# Altium footprint library PCB_library.PcbLib: 28 footprints (part 1 of 2)
Each footprint in its own frame and in the unit in brackets; x right, y up, seen from the top. Pads: shape width x height; smd on the part's side, far side on the other; paste and mask are expansions set on the pad; w line width, h text height; cw(c..) or ccw(c..) is an arc to the next point about the centre after c.
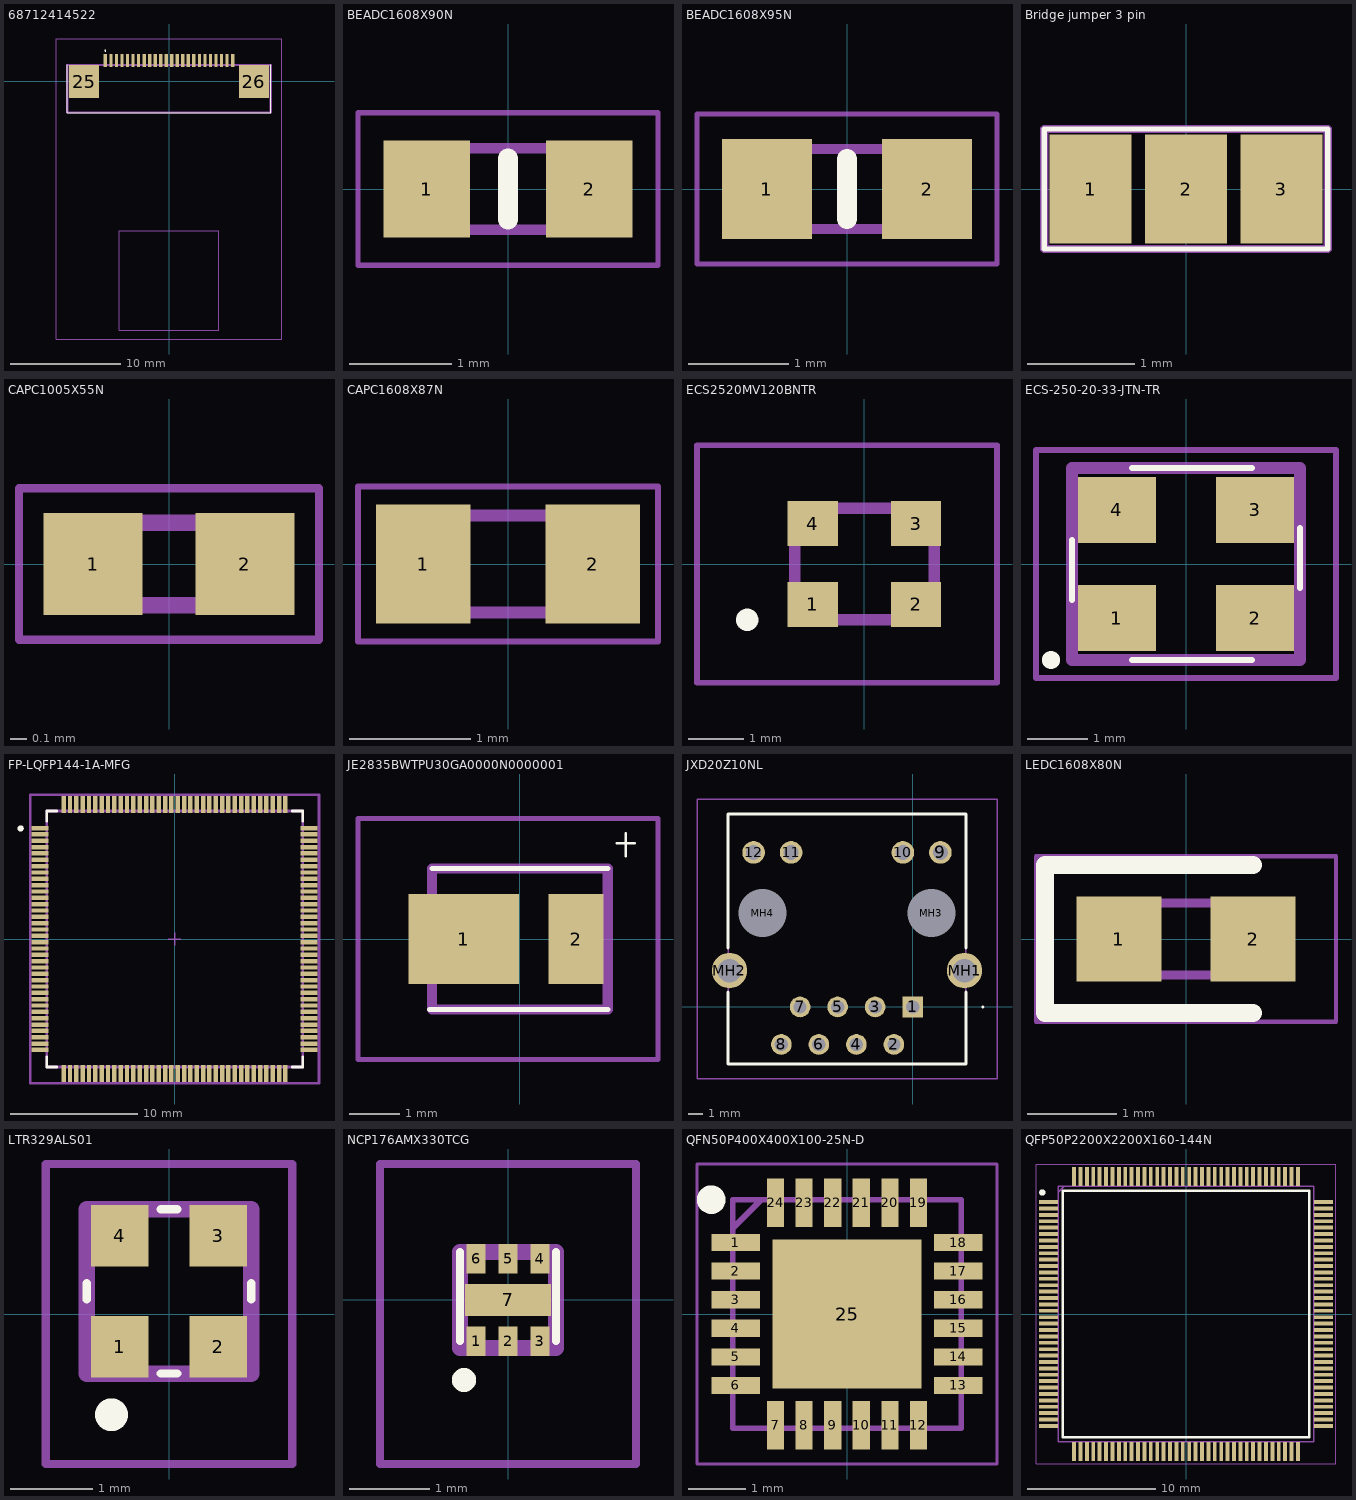
[diagram p0: the footprints below, top view; thin cyan lines are the x and y axes]

## 68712414522 [mm]
pads (26):
  rect 0.3x1.2 smd: 1(-5.75,1.875) 2(-5.25,1.875) 3(-4.75,1.875) 4(-4.25,1.875) 5(-3.75,1.875) 6(-3.25,1.875) 7(-2.75,1.875) 8(-2.25,1.875) 9(-1.75,1.875) 10(-1.25,1.875) 11(-0.75,1.875) 12(-0.25,1.875) 13(0.25,1.875) 14(0.75,1.875) 15(1.25,1.875) 16(1.75,1.875) 17(2.25,1.875) 18(2.75,1.875) 19(3.25,1.875) 20(3.75,1.875) 21(4.25,1.875) 22(4.75,1.875) 23(5.25,1.875) 24(5.75,1.875)
  rect 2.7x3 smd: 25(-7.68,-0.025) 26(7.68,-0.025)
Top Overlay:
  lines w0.1: -9.2,1.475 -9.2,-2.825 9.2,-2.825 9.2,1.475 ; -5.8,2.775 ccw(c-5.75,2.775) -5.7,2.775 ccw(c-5.75,2.775) -5.8,2.775
Mechanical 13:
  lines w0.2: -9.2,-2.825 -9.2,1.475 9.2,1.475 9.2,-2.825 -9.2,-2.825
Mechanical 15:
  lines w0.1: -10.2,-23.3 -10.2,3.825 10.2,3.825 10.2,-23.3 -10.2,-23.3 ; -4.5,-22.5 4.5,-22.5 4.5,-13.5 -4.5,-13.5 -4.5,-22.5
3D body "68712414522.stp": height 2.1, standoff 0, extent -9.2,-2.825 9.2,2.445

## BEADC1608X90N [mm]
pads (2):
  rect 0.85x0.95 smd: 1(-0.8,0) 2(0.8,0)
Top Overlay:
  lines w0.2: 0,-0.3 0,0.3
Mechanical 13:
  lines w0.1: -0.8,-0.4 -0.8,0.4 0.8,0.4 0.8,-0.4 -0.8,-0.4
Mechanical 15:
  lines w0.05: -1.475,-0.75 -1.475,0.75 1.475,0.75 1.475,-0.75 -1.475,-0.75
3D body "FBMH1608HM601-T.stp": height 0.9, standoff 0, extent -0.8,-0.4 0.8,0.4

## BEADC1608X95N [mm]
pads (2):
  rect 0.9x1 smd: 1(-0.8,0) 2(0.8,0)
Top Overlay:
  lines w0.2: 0,-0.3 0,0.3
Mechanical 13:
  lines w0.1: -0.8,-0.4 0.8,-0.4 0.8,0.4 -0.8,0.4 -0.8,-0.4
Mechanical 15:
  lines w0.05: -1.5,-0.75 1.5,-0.75 1.5,0.75 -1.5,0.75 -1.5,-0.75
3D body "FCM1608KF-601T05.stp": height 0.95, standoff 0, extent -0.8,-0.4 0.8,0.4

## Bridge jumper 3 pin [mil]
pads (3):
  rect 30x40 smd mask+0: 1(-35,0) 2(0,0) 3(35,0)
Top Overlay:
  lines w2: -52,-22 52,-22 52,22 -52,22 -52,-22
Mechanical 1:
  lines w3: -52,-22 -52,22 52,22 52,-22 -52,-22

## CAPC1005X55N [mm]
pads (2):
  rect 0.6x0.62 smd: 1(-0.46,0) 2(0.46,0)
Mechanical 13:
  lines w0.1: -0.5,-0.25 -0.5,0.25 0.5,0.25 0.5,-0.25 -0.5,-0.25
Mechanical 15:
  lines w0.05: -0.91,-0.46 -0.91,0.46 0.91,0.46 0.91,-0.46 -0.91,-0.46
3D body "CC0402KRX7R7BB104.stp": height 0.55, standoff 0, extent -0.52,-0.28 0.53,0.27

## CAPC1608X87N [mm]
pads (2):
  rect 0.78x0.98 smd: 1(-0.7,0) 2(0.7,0)
Mechanical 13:
  lines w0.1: -0.8,-0.4 -0.8,0.4 0.8,0.4 0.8,-0.4 -0.8,-0.4
Mechanical 15:
  lines w0.05: -1.24,-0.64 -1.24,0.64 1.24,0.64 1.24,-0.64 -1.24,-0.64
3D body "C0603C300J5GACTU.stp": height 0.87, standoff 0, extent -0.87,-0.48 0.88,0.47

## ECS2520MV120BNTR [mm]
pads (4):
  rect 0.9x0.8 smd: 1(-0.925,-0.725) 2(0.925,-0.725) 3(0.925,0.725) 4(-0.925,0.725)
Top Overlay:
  lines w0.2: -2.2,-1 cw(c-2.1,-1) -2,-1 cw(c-2.1,-1) -2.2,-1
Mechanical 13:
  lines w0.2: -1.25,-1 1.25,-1 1.25,1 -1.25,1 -1.25,-1
Mechanical 15:
  lines w0.1: -3,-2.125 2.375,-2.125 2.375,2.125 -3,2.125 -3,-2.125
3D body "ECS-2520MV-120-BN-TR.stp": height 1, standoff 0, extent -1.295,-1.045 1.295,1.045

## ECS-250-20-33-JTN-TR [mm]
pads (4):
  rect 1.3x1.1 smd: 1(-1.15,-0.9) 2(1.15,-0.9) 3(1.15,0.9) 4(-1.15,0.9)
Top Overlay:
  lines w0.1: -1.9,-0.6 -1.9,0.4 ; -0.9,-1.6 1.1,-1.6 ; -0.9,1.6 1.1,1.6 ; 1.9,-0.4 1.9,0.6
  lines w0.2: -2.3,-1.6 ccw(c-2.25,-1.6) -2.2,-1.6 ; -2.3,-1.6 cw(c-2.25,-1.6) -2.2,-1.6 ; -2.3,-1.6 ccw(c-2.25,-1.6) -2.2,-1.6
Mechanical 13:
  lines w0.2: -1.9,-1.6 -0.875,-1.6 0.975,-1.6 1.9,-1.6 1.9,1.6 0.975,1.6 -0.875,1.6 -1.9,1.6 -1.9,-1.6
Mechanical 15:
  lines w0.1: -2.5,-1.9 2.5,-1.9 2.5,1.9 -2.5,1.9 -2.5,-1.9
3D body: height 0.25, standoff 0, extent -2.1,-1.8 2.1,1.8

## FP-LQFP144-1A-MFG [mm]
pads (144):
  rect 1.35x0.35 smd paste+0 mask+0: 1(-10.625,8.75) 2(-10.625,8.25) 3(-10.625,7.75) 4(-10.625,7.25) 5(-10.625,6.75) 6(-10.625,6.25) 7(-10.625,5.75) 8(-10.625,5.25) 9(-10.625,4.75) 10(-10.625,4.25) 11(-10.625,3.75) 12(-10.625,3.25) 13(-10.625,2.75) 14(-10.625,2.25) 15(-10.625,1.75) 16(-10.625,1.25) 17(-10.625,0.75) 18(-10.625,0.25) 19(-10.625,-0.25) 20(-10.625,-0.75) 21(-10.625,-1.25) 22(-10.625,-1.75) 23(-10.625,-2.25) 24(-10.625,-2.75) 25(-10.625,-3.25) 26(-10.625,-3.75) 27(-10.625,-4.25) 28(-10.625,-4.75) 29(-10.625,-5.25) 30(-10.625,-5.75) 31(-10.625,-6.25) 32(-10.625,-6.75) 33(-10.625,-7.25) 34(-10.625,-7.75) 35(-10.625,-8.25) 36(-10.625,-8.75) 73(10.625,-8.75) 74(10.625,-8.25) 75(10.625,-7.75) 76(10.625,-7.25) 77(10.625,-6.75) 78(10.625,-6.25) 79(10.625,-5.75) 80(10.625,-5.25) 81(10.625,-4.75) 82(10.625,-4.25) 83(10.625,-3.75) 84(10.625,-3.25) 85(10.625,-2.75) 86(10.625,-2.25) 87(10.625,-1.75) 88(10.625,-1.25) 89(10.625,-0.75) 90(10.625,-0.25) 91(10.625,0.25) 92(10.625,0.75) 93(10.625,1.25) 94(10.625,1.75) 95(10.625,2.25) 96(10.625,2.75) 97(10.625,3.25) 98(10.625,3.75) 99(10.625,4.25) 100(10.625,4.75) 101(10.625,5.25) 102(10.625,5.75) 103(10.625,6.25) 104(10.625,6.75) 105(10.625,7.25) 106(10.625,7.75) 107(10.625,8.25) 108(10.625,8.75)
  rect 0.35x1.35 smd paste+0 mask+0: 37(-8.75,-10.625) 38(-8.25,-10.625) 39(-7.75,-10.625) 40(-7.25,-10.625) 41(-6.75,-10.625) 42(-6.25,-10.625) 43(-5.75,-10.625) 44(-5.25,-10.625) 45(-4.75,-10.625) 46(-4.25,-10.625) 47(-3.75,-10.625) 48(-3.25,-10.625) 49(-2.75,-10.625) 50(-2.25,-10.625) 51(-1.75,-10.625) 52(-1.25,-10.625) 53(-0.75,-10.625) 54(-0.25,-10.625) 55(0.25,-10.625) 56(0.75,-10.625) 57(1.25,-10.625) 58(1.75,-10.625) 59(2.25,-10.625) 60(2.75,-10.625) 61(3.25,-10.625) 62(3.75,-10.625) 63(4.25,-10.625) 64(4.75,-10.625) 65(5.25,-10.625) 66(5.75,-10.625) 67(6.25,-10.625) 68(6.75,-10.625) 69(7.25,-10.625) 70(7.75,-10.625) 71(8.25,-10.625) 72(8.75,-10.625) 109(8.75,10.625) 110(8.25,10.625) 111(7.75,10.625) 112(7.25,10.625) 113(6.75,10.625) 114(6.25,10.625) 115(5.75,10.625) 116(5.25,10.625) 117(4.75,10.625) 118(4.25,10.625) 119(3.75,10.625) 120(3.25,10.625) 121(2.75,10.625) 122(2.25,10.625) 123(1.75,10.625) 124(1.25,10.625) 125(0.75,10.625) 126(0.25,10.625) 127(-0.25,10.625) 128(-0.75,10.625) 129(-1.25,10.625) 130(-1.75,10.625) 131(-2.25,10.625) 132(-2.75,10.625) 133(-3.25,10.625) 134(-3.75,10.625) 135(-4.25,10.625) 136(-4.75,10.625) 137(-5.25,10.625) 138(-5.75,10.625) 139(-6.25,10.625) 140(-6.75,10.625) 141(-7.25,10.625) 142(-7.75,10.625) 143(-8.25,10.625) 144(-8.75,10.625)
Top Overlay:
  circle w0.25: c-12.15,8.725 r0.125
  lines w0.2: -10.1,-9.3 -10.1,-10.1 -9.3,-10.1 ; -10.1,9.3 -10.1,10.1 -9.3,10.1 ; 9.3,-10.1 10.1,-10.1 10.1,-9.3 ; 9.3,10.1 10.1,10.1 10.1,9.3
Top 3D Body:
  lines w0.2: -10.1,-10.1 -10.1,10.1 10.1,10.1 10.1,-10.1 -10.1,-10.1
Top Courtyard:
  lines w0.2: -11.4,-11.4 -11.4,11.4 11.4,11.4 11.4,-11.4 -11.4,-11.4
Top Assembly:
  lines w0.2: -11.4,-11.4 -11.4,11.4 11.4,11.4 11.4,-11.4 -11.4,-11.4
  text ".Designator" at 0,0.188 h1
Top Component Center:
  lines w0.1: -0.5,0 0.5,0 ; 0,-0.5 0,0.5
3D body "IC_STMicroelectronics_STM32F767ZIT7TR_eec.STEP": height 0.25, standoff 0, extent -11.4,-11.4 11.4,11.4

## JE2835BWTPU30GA0000N0000001 [mm]
pads (2):
  rect 2.2x1.8 smd: 1(-1.12,0)
  rect 1.1x1.8 smd: 2(1.12,0)
Top Overlay:
  lines w0.051: 1.93,1.905 2.286,1.905 ; 2.108,1.651 2.108,2.108
  lines w0.1: -1.8,-1.4 1.75,-1.4 ; -1.75,1.4 1.75,1.4
Mechanical 13:
  lines w0.2: -1.75,-1.4 -1.75,1.4 1.75,1.4 1.75,-1.4 -1.75,-1.4
Mechanical 15:
  lines w0.1: -3.22,-2.4 -3.22,2.4 2.75,2.4 2.75,-2.4 -3.22,-2.4

## JXD20Z10NL [mm]
pads (16):
  rect 1.4x1.4 hole 0.9: 1(0,0)
  round 1.4 hole 0.9: 2(-1.27,-2.54) 3(-2.54,0) 4(-3.81,-2.54) 5(-5.08,0) 6(-6.35,-2.54) 7(-7.62,0) 8(-8.89,-2.54)
  round 1.53 hole 1.02: 9(1.88,10.46) 10(-0.66,10.46) 11(-8.23,10.46) 12(-10.77,10.46)
  round 2.4 hole 1.6: MH1(3.51,2.46) MH2(-12.4,2.46)
  round 1.625 hole 3.25 unplated: MH3(1.27,6.35) MH4(-10.16,6.35)
Top Overlay:
  lines w0.1: 4.7,0 ccw(c4.75,0) 4.8,0 ccw(c4.75,0) 4.7,0
  lines w0.2: -12.495,1 -12.495,-3.85 3.6,-3.85 3.605,1 ; -12.495,4 -12.495,13.05 3.6,13.05 3.6,4
Mechanical 13:
  lines w0.1: -12.495,-3.85 -12.495,13.05 3.605,13.05 3.605,-3.85 -12.495,-3.85
Mechanical 15:
  lines w0.1: -14.6,-4.85 -14.6,14.05 5.71,14.05 5.71,-4.85 -14.6,-4.85
3D body "JXD2-0Z10NL.stp": height 17.3, standoff -5, extent -13.1,-3.85 4.21,13.05

## LEDC1608X80N [mm]
pads (2):
  rect 0.95x0.95 smd: 1(-0.75,0) 2(0.75,0)
Top Overlay:
  lines w0.2: 0.75,-0.825 -1.575,-0.825 -1.575,0.825 0.75,0.825
Mechanical 13:
  lines w0.1: -0.8,0.133 -0.533,0.4 ; -0.8,-0.4 0.8,-0.4 0.8,0.4 -0.8,0.4 -0.8,-0.4
Mechanical 15:
  lines w0.05: -1.675,-0.925 1.675,-0.925 1.675,0.925 -1.675,0.925 -1.675,-0.925
3D body "150060RS75000.stp": height 0.7, standoff 0, extent -0.8,-0.4 0.8,0.4

## LTR329ALS01 [mm]
pads (4):
  rect 0.7x0.75 smd: 1(-0.6,-0.4) 2(0.6,-0.4) 3(0.6,0.95) 4(-0.6,0.95)
Top Overlay:
  lines w0.1: -1,0.175 -1,0.375 ; -0.1,-0.725 0.1,-0.725 ; -0.1,1.275 0.1,1.275 ; 1,0.175 1,0.375
  lines w0.2: -0.8,-1.225 cw(c-0.7,-1.225) -0.6,-1.225 cw(c-0.7,-1.225) -0.8,-1.225
Mechanical 13:
  lines w0.2: -1,-0.725 1,-0.725 1,1.275 -1,1.275 -1,-0.725
Mechanical 15:
  lines w0.1: -1.5,-1.825 1.5,-1.825 1.5,1.825 -1.5,1.825 -1.5,-1.825
3D body "LTR-329ALS-01.stp": height 0.71, standoff -0.01, extent -1,-0.7 1,1.3

## NCP176AMX330TCG [mm]
pads (7):
  rect 0.24x0.37 smd: 1(-0.4,-0.515) 2(0,-0.515) 3(0.4,-0.515) 4(0.4,0.515) 5(0,0.515) 6(-0.4,0.515)
  rect 1.08x0.4 smd: 7(0,0)
Top Overlay:
  lines w0.1: -0.6,-0.515 -0.6,0.6 ; 0.6,-0.515 0.6,0.6
  lines w0.2: -0.6,-1 cw(c-0.55,-1) -0.5,-1 cw(c-0.55,-1) -0.6,-1
Mechanical 13:
  lines w0.2: -0.6,-0.6 0.6,-0.6 0.6,0.6 -0.6,0.6 -0.6,-0.6
Mechanical 15:
  lines w0.1: -1.6,-2.05 1.6,-2.05 1.6,1.7 -1.6,1.7 -1.6,-2.05
3D body "NCP176AMX330TCG.stp": height 0.55, standoff 0, extent -0.6,-0.6 0.6,0.6

## QFN50P400X400X100-25N-D [mm]
pads (25):
  rect 0.85x0.3 smd: 1(-1.95,1.25) 2(-1.95,0.75) 3(-1.95,0.25) 4(-1.95,-0.25) 5(-1.95,-0.75) 6(-1.95,-1.25) 13(1.95,-1.25) 14(1.95,-0.75) 15(1.95,-0.25) 16(1.95,0.25) 17(1.95,0.75) 18(1.95,1.25)
  rect 0.3x0.85 smd: 7(-1.25,-1.95) 8(-0.75,-1.95) 9(-0.25,-1.95) 10(0.25,-1.95) 11(0.75,-1.95) 12(1.25,-1.95) 19(1.25,1.95) 20(0.75,1.95) 21(0.25,1.95) 22(-0.25,1.95) 23(-0.75,1.95) 24(-1.25,1.95)
  rect 2.6x2.6 smd: 25(0,0)
Top Overlay:
  circle w0.25: c-2.375,2 r0.125
Mechanical 13:
  lines w0.1: -2,1.5 -1.5,2 ; -2,-2 2,-2 2,2 -2,2 -2,-2
Mechanical 15:
  lines w0.05: -2.625,-2.625 2.625,-2.625 2.625,2.625 -2.625,2.625 -2.625,-2.625
3D body "LAN8742A-CZ-TR.stp": height 1, standoff 0, extent -2.05,-2.05 2.05,2.05

## QFP50P2200X2200X160-144N [mm]
pads (144):
  rect 1.475x0.3 smd: 1(-10.738,8.75) 2(-10.738,8.25) 3(-10.738,7.75) 4(-10.738,7.25) 5(-10.738,6.75) 6(-10.738,6.25) 7(-10.738,5.75) 8(-10.738,5.25) 9(-10.738,4.75) 10(-10.738,4.25) 11(-10.738,3.75) 12(-10.738,3.25) 13(-10.738,2.75) 14(-10.738,2.25) 15(-10.738,1.75) 16(-10.738,1.25) 17(-10.738,0.75) 18(-10.738,0.25) 19(-10.738,-0.25) 20(-10.738,-0.75) 21(-10.738,-1.25) 22(-10.738,-1.75) 23(-10.738,-2.25) 24(-10.738,-2.75) 25(-10.738,-3.25) 26(-10.738,-3.75) 27(-10.738,-4.25) 28(-10.738,-4.75) 29(-10.738,-5.25) 30(-10.738,-5.75) 31(-10.738,-6.25) 32(-10.738,-6.75) 33(-10.738,-7.25) 34(-10.738,-7.75) 35(-10.738,-8.25) 36(-10.738,-8.75) 73(10.738,-8.75) 74(10.738,-8.25) 75(10.738,-7.75) 76(10.738,-7.25) 77(10.738,-6.75) 78(10.738,-6.25) 79(10.738,-5.75) 80(10.738,-5.25) 81(10.738,-4.75) 82(10.738,-4.25) 83(10.738,-3.75) 84(10.738,-3.25) 85(10.738,-2.75) 86(10.738,-2.25) 87(10.738,-1.75) 88(10.738,-1.25) 89(10.738,-0.75) 90(10.738,-0.25) 91(10.738,0.25) 92(10.738,0.75) 93(10.738,1.25) 94(10.738,1.75) 95(10.738,2.25) 96(10.738,2.75) 97(10.738,3.25) 98(10.738,3.75) 99(10.738,4.25) 100(10.738,4.75) 101(10.738,5.25) 102(10.738,5.75) 103(10.738,6.25) 104(10.738,6.75) 105(10.738,7.25) 106(10.738,7.75) 107(10.738,8.25) 108(10.738,8.75)
  rect 0.3x1.475 smd: 37(-8.75,-10.738) 38(-8.25,-10.738) 39(-7.75,-10.738) 40(-7.25,-10.738) 41(-6.75,-10.738) 42(-6.25,-10.738) 43(-5.75,-10.738) 44(-5.25,-10.738) 45(-4.75,-10.738) 46(-4.25,-10.738) 47(-3.75,-10.738) 48(-3.25,-10.738) 49(-2.75,-10.738) 50(-2.25,-10.738) 51(-1.75,-10.738) 52(-1.25,-10.738) 53(-0.75,-10.738) 54(-0.25,-10.738) 55(0.25,-10.738) 56(0.75,-10.738) 57(1.25,-10.738) 58(1.75,-10.738) 59(2.25,-10.738) 60(2.75,-10.738) 61(3.25,-10.738) 62(3.75,-10.738) 63(4.25,-10.738) 64(4.75,-10.738) 65(5.25,-10.738) 66(5.75,-10.738) 67(6.25,-10.738) 68(6.75,-10.738) 69(7.25,-10.738) 70(7.75,-10.738) 71(8.25,-10.738) 72(8.75,-10.738) 109(8.75,10.738) 110(8.25,10.738) 111(7.75,10.738) 112(7.25,10.738) 113(6.75,10.738) 114(6.25,10.738) 115(5.75,10.738) 116(5.25,10.738) 117(4.75,10.738) 118(4.25,10.738) 119(3.75,10.738) 120(3.25,10.738) 121(2.75,10.738) 122(2.25,10.738) 123(1.75,10.738) 124(1.25,10.738) 125(0.75,10.738) 126(0.25,10.738) 127(-0.25,10.738) 128(-0.75,10.738) 129(-1.25,10.738) 130(-1.75,10.738) 131(-2.25,10.738) 132(-2.75,10.738) 133(-3.25,10.738) 134(-3.75,10.738) 135(-4.25,10.738) 136(-4.75,10.738) 137(-5.25,10.738) 138(-5.75,10.738) 139(-6.25,10.738) 140(-6.75,10.738) 141(-7.25,10.738) 142(-7.75,10.738) 143(-8.25,10.738) 144(-8.75,10.738)
Top Overlay:
  circle w0.25: c-11.225,9.5 r0.125
  lines w0.2: -9.65,-9.65 9.65,-9.65 9.65,9.65 -9.65,9.65 -9.65,-9.65
Mechanical 13:
  lines w0.1: -10,9.5 -9.5,10 ; -10,-10 10,-10 10,10 -10,10 -10,-10
Mechanical 15:
  lines w0.05: -11.725,-11.725 11.725,-11.725 11.725,11.725 -11.725,11.725 -11.725,-11.725
3D body "STM32F767ZIT6.stp": height 1.6, standoff 0, extent -11,-11 11,11